# Altium footprint library Hydrolib_pcb.PcbLib: 101 footprints (part 7 of 7)
Each footprint in its own frame and in the unit in brackets; x right, y up, seen from the top. Pads: shape width x height; smd on the part's side, far side on the other; paste and mask are expansions set on the pad; w line width, h text height; cw(c..) or ccw(c..) is an arc to the next point about the centre after c.
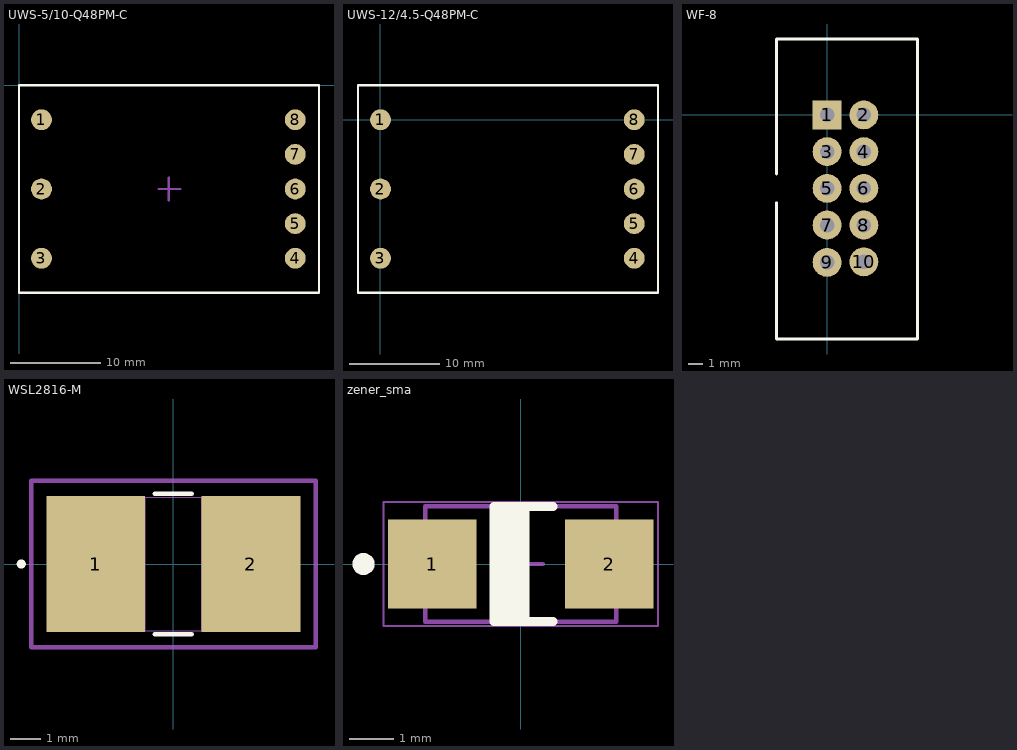
[diagram p6: the footprints below, top view; thin cyan lines are the x and y axes]

## UWS-5/10-Q48PM-C [mm]
height 9.14
pads (8):
  round 2.3 smd: 1(2.469,-3.81) 2(2.469,-11.43) 3(2.469,-19.05) 4(30.409,-19.05) 5(30.409,-15.24) 6(30.409,-11.43) 7(30.409,-7.62) 8(30.409,-3.81)
Top Overlay:
  lines w0.254: 0,-22.86 33.02,-22.86 33.02,0 0,0 0,-22.86
Pattern top:
  text ".Designator" at 10.704,-10.89 h2.15
Mechanical 15:
  lines w0.254: 15.394,-11.43 17.735,-11.43 ; 16.485,-12.678 16.485,-10.178
3D body "mps_dcdc_uws_smt_a.step": height 9.13, standoff -0.01, extent 0,-23.114 33.274,0

## UWS-12/4.5-Q48PM-C [mm]
pads (8):
  round 2.3 smd: 1(0,0) 2(0,-7.62) 3(0,-15.24) 4(27.94,-15.24) 5(27.94,-11.43) 6(27.94,-7.62) 7(27.94,-3.81) 8(27.94,0)
Top Overlay:
  lines w0.254: -2.469,-19.05 30.551,-19.05 30.551,3.81 -2.469,3.81 -2.469,-19.05
Pattern top:
  text ".Designator" at 8.235,-7.08 h2.15
3D body: height 0.25, standoff 0, extent -2.469,-19.05 30.551,3.81

## WF-8 [mm] "IDC-10 Male Connector"
height 9
pads (10):
  rect 2x2 hole 1: 1(0,0)
  round 2 hole 1: 2(2.54,0) 3(0,-2.54) 4(2.54,-2.54) 5(0,-5.08) 6(2.54,-5.08) 7(0,-7.62) 8(2.54,-7.62) 9(0,-10.2) 10(2.54,-10.16)
Top Overlay:
  lines w0.2: -3.5,-6.075 -3.5,-15.5 6.25,-15.5 6.25,5.25 -3.5,5.25 -3.5,-4.075
3D body "User Library-BH-10__64BH-10.STEP": height 9.1, standoff -3, extent -3.83,-15.325 5.47,5.175

## WSL2816-M [mil]
pads (2):
  rect 130x179 smd paste+0 mask+0: 1(-102,0) 2(102,0)
Top Overlay:
  circle w6: c-200,0 r3
  lines w6: -24.25,-92.5 24.25,-92.5 ; -24.25,92.5 24.25,92.5
Pattern top:
  lines w6: -187,-109.5 187,-109.5 187,109.5 -187,109.5 -187,-109.5
  text ".Designator" at -149.61,-3.94 h84.65
Mechanical 13:
  circle w0: c-97,0 r3
  lines w1: -145,-87.5 -145,87.5 ; -145,-87.5 145,-87.5 ; -145,-87.5 -37,-87.5 -37,87.5 -145,87.5 ; -145,-87.5 -145,87.5 ; -145,87.5 145,87.5 ; 145,-87.5 145,87.5 ; 145,-87.5 145,87.5 ; 145,-87.5 37,-87.5 37,87.5 145,87.5
3D body: height 10, standoff 0, extent 0,0 10,10
3D body "WSL2816-M.stp": height 35, standoff 0, extent -145,-87.48 145,87.48

## zener_sma [mm]
height 2.2
pads (2):
  rect 2x2 smd: 1(-2,0) 2(2,0)
Top Overlay:
  circle w0.25: c-3.55,0 r0.125
  rectangle: -0.578,-1.3 0.2,1.3
  lines w0.2: 0.736,-1.3 -0.6,-1.3 -0.6,1.3 ; 0.736,1.3 -0.6,1.3 ; -0.6,1.3 -0.6,1.3
Pattern top:
  text ".Designator" at 0,1.6 h1.52
Mechanical 13:
  lines w0.1: -2.16,-1.3 -2.16,1.3 2.16,1.3 2.16,-1.3 -2.16,-1.3
Mechanical 15:
  lines w0.05: -3.1,-1.4 3.1,-1.4 3.1,1.4 -3.1,1.4 -3.1,-1.4
  lines w0.1: -0.5,0 0.5,0 ; 0,-0.5 0,0.5
3D body: height 2.2, standoff 0.05, extent -2.16,-1.3 2.16,1.3